# Altium footprint library LC-Standard-FootPrints-AD-V1.00工程师同事给的标准库（含3D）.PcbLib: 463 footprints (part 7 of 29)
Each footprint in its own frame and in the unit in brackets; x right, y up, seen from the top. Pads: shape width x height; smd on the part's side, far side on the other; paste and mask are expansions set on the pad; w line width, h text height; cw(c..) or ccw(c..) is an arc to the next point about the centre after c.
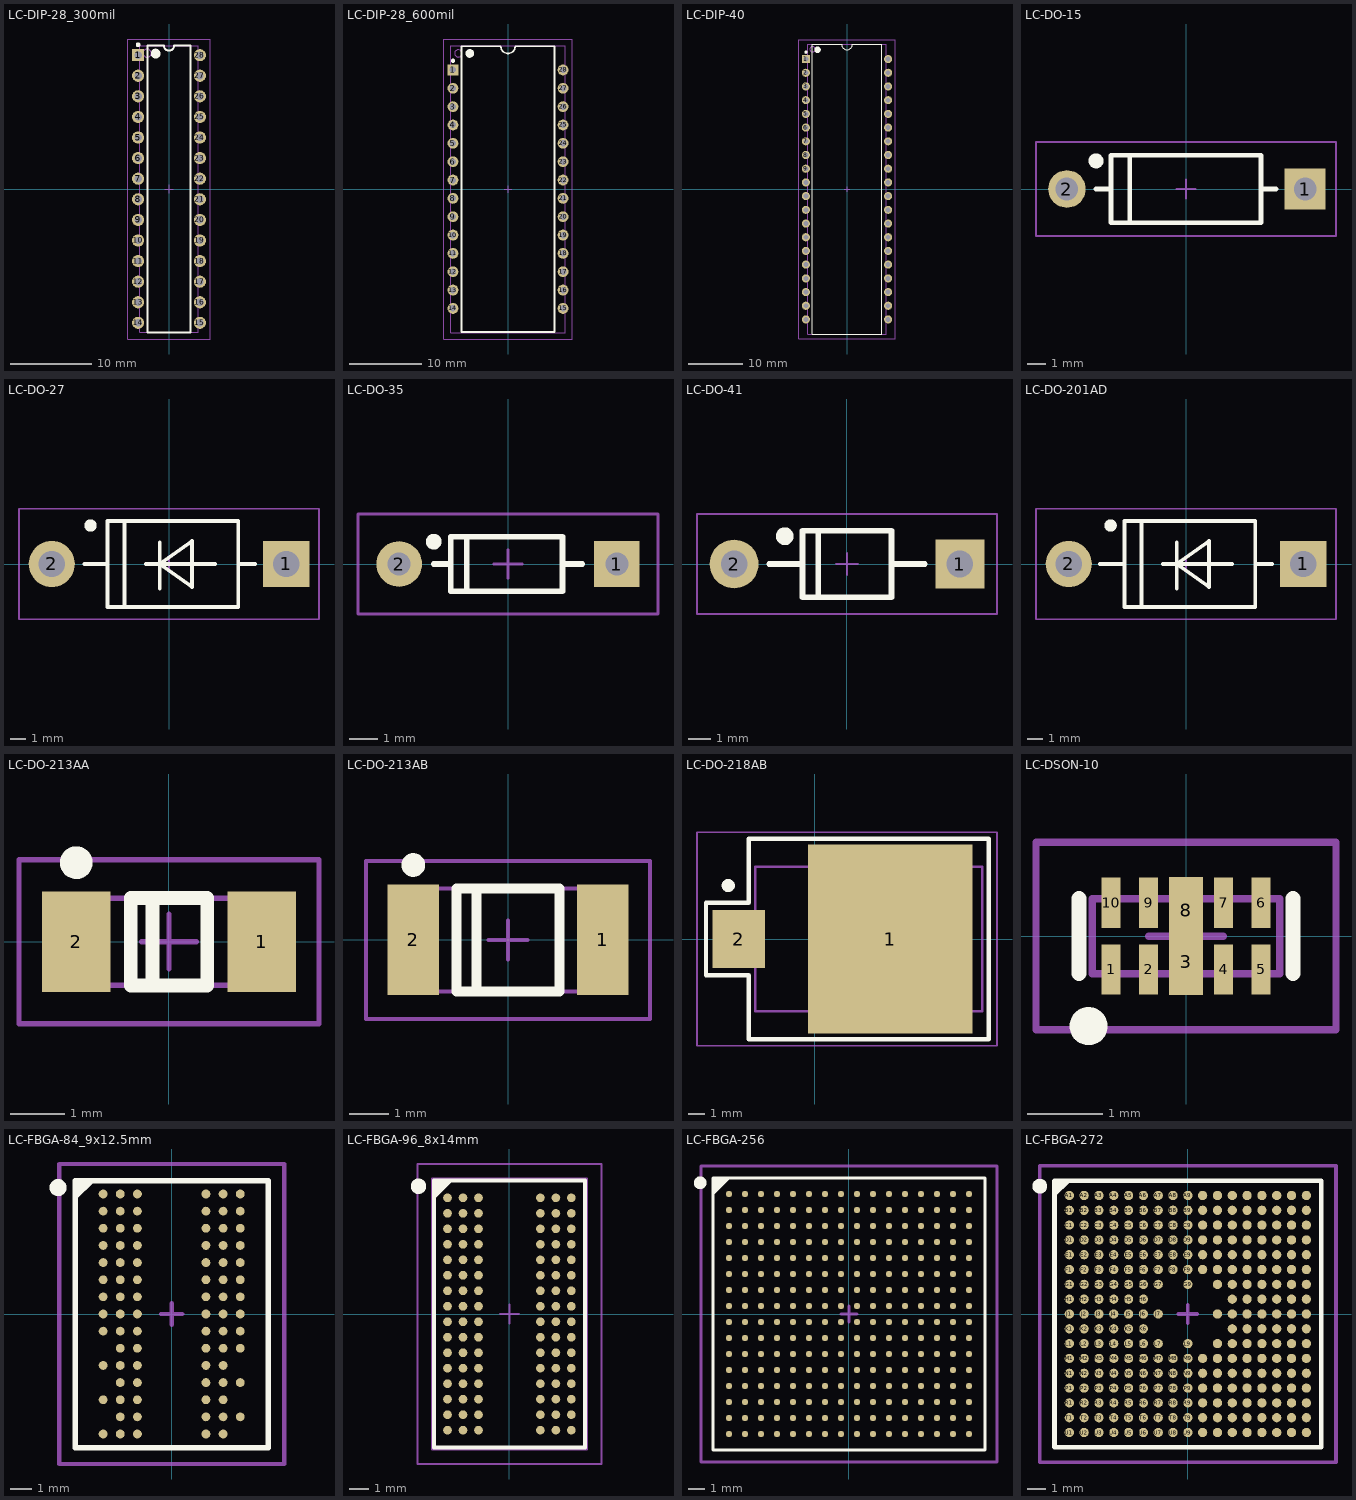
[diagram p6: the footprints below, top view; thin cyan lines are the x and y axes]

## LC-DIP-28_300mil [mm]
pads (28):
  rect 1.5x1.5 hole 0.9: 1(-3.81,16.51)
  round 1.5 hole 0.9: 2(-3.81,13.97) 3(-3.81,11.43) 4(-3.81,8.89) 5(-3.81,6.35) 6(-3.81,3.81) 7(-3.81,1.27) 8(-3.81,-1.27) 9(-3.81,-3.81) 10(-3.81,-6.35) 11(-3.81,-8.89) 12(-3.81,-11.43) 13(-3.81,-13.97) 14(-3.81,-16.51) 15(3.81,-16.51) 16(3.81,-13.97) 17(3.81,-11.43) 18(3.81,-8.89) 19(3.81,-6.35) 20(3.81,-3.81) 21(3.81,-1.27) 22(3.81,1.27) 23(3.81,3.81) 24(3.81,6.35) 25(3.81,8.89) 26(3.81,11.43) 27(3.81,13.97) 28(3.81,16.51)
Top Overlay:
  circle w0.6: c-1.65,16.7 r0.3
  circle w0.3: c-3.8,17.79 r0.15
  lines w0.254: -2.65,-17.7 2.65,-17.7 2.65,17.7 0.635,17.7 cw(c0,17.7) -0.635,17.7 -2.65,17.7 -2.65,-17.7
Mechanical 13:
  circle w0.1: c-2.7,16.75 r0.5
  lines w0.1: -3.6,-17.65 3.6,-17.65 3.6,17.65 -3.6,17.65 -3.6,-17.65
Mechanical 15:
  lines w0.1: -0.5,0 0.5,0 ; 0,-0.5 0,0.5 ; -5.1,-18.5 -5.1,18.5 5.1,18.5 5.1,-18.5 -5.1,-18.5

## LC-DIP-28_600mil [mm]
pads (28):
  rect 1.5x1.5 hole 0.9: 1(-7.62,16.51)
  round 1.5 hole 0.9: 2(-7.62,13.97) 3(-7.62,11.43) 4(-7.62,8.89) 5(-7.62,6.35) 6(-7.62,3.81) 7(-7.62,1.27) 8(-7.62,-1.27) 9(-7.62,-3.81) 10(-7.62,-6.35) 11(-7.62,-8.89) 12(-7.62,-11.43) 13(-7.62,-13.97) 14(-7.62,-16.51) 15(7.62,-16.51) 16(7.62,-13.97) 17(7.62,-11.43) 18(7.62,-8.89) 19(7.62,-6.35) 20(7.62,-3.81) 21(7.62,-1.27) 22(7.62,1.27) 23(7.62,3.81) 24(7.62,6.35) 25(7.62,8.89) 26(7.62,11.43) 27(7.62,13.97) 28(7.62,16.51)
Top Overlay:
  circle w0.6: c-5.3,18.8 r0.3
  circle w0.3: c-7.61,17.79 r0.15
  lines w0.254: -6.45,-19.8 6.45,-19.8 6.45,19.8 1,19.8 cw(c0,19.8) -1,19.8 -6.45,19.8 -6.45,-19.8
Mechanical 13:
  circle w0.1: c-6.9,18.8 r0.5
  lines w0.1: -7.94,-19.875 7.94,-19.875 7.94,19.875 -7.94,19.875 -7.94,-19.875
Mechanical 15:
  lines w0.1: -0.5,0 0.5,0 ; 0,-0.5 0,0.5 ; -8.9,-20.75 8.9,-20.75 8.9,20.75 -8.9,20.75 -8.9,-20.75

## LC-DIP-40 [mm]
pads (40):
  rect 1.5x1.5 hole 0.9: 1(-7.62,24.13)
  round 1.5 hole 0.9: 2(-7.62,21.59) 3(-7.62,19.05) 4(-7.62,16.51) 5(-7.62,13.97) 6(-7.62,11.43) 7(-7.62,8.89) 8(-7.62,6.35) 9(-7.62,3.81) 10(-7.62,1.27) 11(-7.62,-1.27) 12(-7.62,-3.81) 13(-7.62,-6.35) 14(-7.62,-8.89) 15(-7.62,-11.43) 16(-7.62,-13.97) 17(-7.62,-16.51) 18(-7.62,-19.05) 19(-7.62,-21.59) 20(-7.62,-24.13) 21(7.62,-24.13) 22(7.62,-21.59) 23(7.62,-19.05) 24(7.62,-16.51) 25(7.62,-13.97) 26(7.62,-11.43) 27(7.62,-8.89) 28(7.62,-6.35) 29(7.62,-3.81) 30(7.62,-1.27) 31(7.62,1.27) 32(7.62,3.81) 33(7.62,6.35) 34(7.62,8.89) 35(7.62,11.43) 36(7.62,13.97) 37(7.62,16.51) 38(7.62,19.05) 39(7.62,21.59) 40(7.62,24.13)
Top Overlay:
  circle w0.3: c-7.61,25.41 r0.15
  circle w0.6: c-5.45,25.85 r0.3
  lines w0.2: -6.45,-26.85 -6.45,26.85 -1,26.85 ccw(c0,26.85) 1,26.85 6.45,26.85 6.45,-26.85 -6.45,-26.85
Mechanical 13:
  circle w0.1: c-6.4,25.95 r0.5
  lines w0.1: -7.3,-26.85 -7.3,26.85 7.3,26.85 7.3,-26.85 -7.3,-26.85
Mechanical 15:
  lines w0.1: -0.5,0 0.5,0 ; 0,-0.5 0,0.5 ; -8.9,-27.75 -8.9,27.75 8.9,27.75 8.9,-27.75 -8.9,-27.75

## LC-DO-15 [mm]
pads (2):
  rect 2.2x2.2 hole 1.2: 1(6.35,0)
  round 2 hole 1.2: 2(-6.35,0)
Top Overlay:
  circle w0.4: c-4.8,1.5 r0.2
  lines w0.254: -4.8,0 -4,0 ; -3,-1.8 -3,1.8 ; 4,0 4.8,0 ; -4,-1.8 -4,1.8 4,1.8 4,-1.8 -4,-1.8
Mechanical 15:
  lines w0.1: -0.5,0 0.5,0 ; 0,-0.5 0,0.5 ; -8,-2.5 8,-2.5 8,2.5 -8,2.5 -8,-2.5
3D body: height 4.03, standoff -1.5, extent -6.875,-1.749 6.875,1.748

## LC-DO-27 [mm]
pads (2):
  rect 3x3 hole 1.7: 1(7.62,0)
  round 3 hole 1.7: 2(-7.62,0)
Top Overlay:
  circle w0.4: c-5.1,2.5 r0.2
  lines w0.254: -5.5,0 -4,0 ; -2.9,-2.8 -2.9,2.8 ; -1.5,0 -0.6,0 ; -0.6,-1.6 -0.6,1.4 ; 3,0 -0.6,0 ; 4.5,0 5.6,0 ; -0.6,0 1.5,-1.5 1.5,1.5 -0.6,0 ; -4,-2.8 -4,2.8 4.5,2.8 4.5,-2.8 -4,-2.8
Mechanical 15:
  lines w0.1: -0.5,0 0.5,0 ; 0,-0.5 0,0.5 ; -9.75,-3.6 -9.75,3.6 9.75,3.6 9.75,-3.6 -9.75,-3.6
3D body: height 6.6, standoff -5, extent -8.28,-2.8 8.28,2.8

## LC-DO-35 [mm]
pads (2):
  rect 1.6x1.6 hole 0.8: 1(3.81,0)
  round 1.6 hole 0.8: 2(-3.81,0)
Top Overlay:
  circle w0.3: c-2.6,0.78 r0.125
  lines w0.2: -2.6,0 -2.001,0 ; -1.448,-0.95 -1.448,0.95 ; 1.899,-0.95 -2.001,-0.95 -2.001,0.95 1.899,0.95 ; 1.911,-0.95 1.911,0.95 ; 1.911,0 2.6,0
Mechanical 15:
  lines w0.1: -0.5,0 0.5,0 ; 0,-0.5 0,0.5 ; -5.25,-1.75 5.25,-1.75 5.25,1.75 -5.25,1.75 -5.25,-1.75
3D body: height 1.92, standoff -1.9, extent -4.098,-0.888 4.072,0.914

## LC-DO-41 [mm]
pads (2):
  rect 2.2x2.2 hole 1.2: 1(5.08,0)
  round 2.2 hole 1.2: 2(-5.08,0)
Top Overlay:
  circle w0.4: c-2.8,1.25 r0.2
  lines w0.254: -3.5,0 -2,0 ; -1.3,-1.4 -1.3,1.5 ; 2,0 3.5,0 ; -2,-1.5 2,-1.5 2,1.5 -2,1.5 -2,-1.5
Mechanical 15:
  lines w0.1: -0.5,0 0.5,0 ; 0,-0.5 0,0.5 ; -6.75,-2.25 6.75,-2.25 6.75,2.25 -6.75,2.25 -6.75,-2.25
3D body: height 3.35, standoff -2, extent -5.51,-1.35 5.51,1.35

## LC-DO-201AD [mm]
pads (2):
  rect 3x3 hole 1.7: 1(7.62,0)
  round 3 hole 1.7: 2(-7.62,0)
Top Overlay:
  circle w0.4: c-4.9,2.5 r0.2
  lines w0.254: -5.6,0 -4,0 ; -2.9,-2.8 -2.9,2.8 ; -1.5,0 -0.6,0 ; -0.6,-1.6 -0.6,1.4 ; 3,0 -0.6,0 ; 4.5,0 5.6,0 ; -0.6,0 1.5,1.5 1.5,-1.5 -0.6,0 ; -4,-2.8 4.5,-2.8 4.5,2.8 -4,2.8 -4,-2.8
Mechanical 15:
  lines w0.1: -0.5,0 0.5,0 ; 0,-0.5 0,0.5 ; -9.75,-3.6 9.75,-3.6 9.75,3.6 -9.75,3.6 -9.75,-3.6
3D body: height 6.6, standoff -5, extent -8.28,-2.8 8.28,2.8

## LC-DO-213AA [mm]
pads (2):
  rect 1.25x1.85 smd: 1(1.7,0) 2(-1.7,0)
Top Overlay:
  circle w0.3: c-1.7,1.45 r0.15
  lines w0.254: -0.3,-0.7 -0.3,0.8 ; -0.7,-0.8 -0.7,0.8 0.7,0.8 0.7,-0.8 -0.7,-0.8
Mechanical 13:
  lines w0.1: -1.8,-0.8 -1.8,0.8 1.8,0.8 1.8,-0.8 -1.8,-0.8
Mechanical 15:
  lines w0.1: -0.5,0 0.5,0 ; 0,-0.5 0,0.5 ; -2.75,-1.5 2.75,-1.5 2.75,1.5 -2.75,1.5 -2.75,-1.5

## LC-DO-213AB [mm]
pads (2):
  rect 1.3x2.8 smd: 1(2.4,0) 2(-2.4,0)
Top Overlay:
  circle w0.3: c-2.4,1.9 r0.15
  lines w0.254: -0.8,-1.3 -0.8,1.3 ; -1.3,-1.3 1.3,-1.3 1.3,1.3 -1.3,1.3 -1.3,-1.3
Mechanical 13:
  lines w0.1: -2.5,-1.3 2.5,-1.3 2.5,1.3 -2.5,1.3 -2.5,-1.3
Mechanical 15:
  lines w0.1: -0.5,0 0.5,0 ; 0,-0.5 0,0.5 ; -3.6,-2 -3.6,2 3.6,2 3.6,-2 -3.6,-2

## LC-DO-218AB [mm]
pads (2):
  rect 10x11.5 smd: 1(4.6,0)
  rect 3.2x3.5 smd: 2(-4.6,0)
Top Overlay:
  circle w0.4: c-5.25,3.25 r0.2
  lines w0.254: -6.6,-2.2 -4,-2.2 -4,-6.1 10.6,-6.1 10.6,6.1 -4,6.1 -4,2.2 -6.6,2.2 -6.6,-2.2
Mechanical 13:
  lines w0.152: -3.6,-4.4 10.2,-4.4 10.2,4.4 -3.6,4.4 -3.6,-4.4
Mechanical 15:
  lines w0.1: 4.1,0 5.1,0 ; 4.6,-0.5 4.6,0.5 ; -7.15,-6.5 -7.15,6.5 11.1,6.5 11.1,-6.5 -7.15,-6.5
3D body: height 5, standoff 0, extent -5.2,-5 10.229,5

## LC-DSON-10 [mm]
pads (10):
  rect 0.25x0.67 smd mask+0.051: 1(-1,-0.445) 2(-0.5,-0.445) 4(0.5,-0.445) 5(1,-0.445) 6(1,0.445) 7(0.5,0.445) 9(-0.5,0.445) 10(-1,0.445)
  rect 0.45x0.889 smd mask+0.051: 3(0,-0.343) 8(0,0.343)
Top Overlay:
  circle w0.254: c-1.3,-1.2 r0.127
  lines w0.2: -1.43,-0.5 -1.43,0.5 ; 1.43,-0.5 1.43,0.5
Mechanical 13:
  lines w0.1: -1.25,-0.5 1.25,-0.5 1.25,0.5 -1.25,0.5 -1.25,-0.5
Mechanical 15:
  lines w0.1: -0.5,0 0.5,0 ; 0,-0.5 0,0.5 ; -2,-1.25 -2,1.25 2,1.25 2,-1.25 -2,-1.25

## LC-FBGA-84_9x12.5mm [mm]
pads (84):
  round 0.41 smd: A1(-3.2,5.6) A2(-2.4,5.6) A3(-1.6,5.6) A7(1.6,5.6) A8(2.4,5.6) A9(3.2,5.6) B1(-3.2,4.8) B2(-2.4,4.8) B3(-1.6,4.8) B7(1.6,4.8) B8(2.4,4.8) B9(3.2,4.8) C1(-3.2,4) C2(-2.4,4) C3(-1.6,4) C7(1.6,4) C8(2.4,4) C9(3.2,4) D1(-3.2,3.2) D2(-2.4,3.2) D3(-1.6,3.2) D7(1.6,3.2) D8(2.4,3.2) D9(3.2,3.2) E1(-3.2,2.4) E2(-2.4,2.4) E3(-1.6,2.4) E7(1.6,2.4) E8(2.4,2.4) E9(3.2,2.4) F1(-3.2,1.6) F2(-2.4,1.6) F3(-1.6,1.6) F7(1.6,1.6) F8(2.4,1.6) F9(3.2,1.6) G1(-3.2,0.8) G2(-2.4,0.8) G3(-1.6,0.8) G7(1.6,0.8) G8(2.4,0.8) G9(3.2,0.8) H1(-3.2,0) H2(-2.4,0) H3(-1.6,0) H7(1.6,0) H8(2.4,0) H9(3.2,0) J1(-3.2,-0.8) J2(-2.4,-0.8) J3(-1.6,-0.8) J7(1.6,-0.8) J8(2.4,-0.8) J9(3.2,-0.8) K2(-2.4,-1.6) K3(-1.6,-1.6) K7(1.6,-1.6) K8(2.4,-1.6) K9(3.2,-1.6) L1(-3.2,-2.4) L2(-2.4,-2.4) L3(-1.6,-2.4) L7(1.6,-2.4) L8(2.4,-2.4) M2(-2.4,-3.2) M3(-1.6,-3.2) M7(1.6,-3.2) M8(2.4,-3.2) M9(3.2,-3.2) N1(-3.2,-4) N2(-2.4,-4) N3(-1.6,-4) N7(1.6,-4) N8(2.4,-4) P2(-2.4,-4.8) P3(-1.6,-4.8) P7(1.6,-4.8) P8(2.4,-4.8) P9(3.2,-4.8) R1(-3.2,-5.6) R2(-2.4,-5.6) R3(-1.6,-5.6) R7(1.6,-5.6) R8(2.4,-5.6)
Top Overlay:
  circle w0.4: c-5.3,5.9 r0.2
  region: -4.5,6.231 -4.5,5.3 -3.573,6.227 -3.573,6.231
  lines w0.254: -4.5,-6.25 4.5,-6.25 4.5,6.223 -4.5,6.223 -4.5,-6.25
Mechanical 15:
  lines w0.2: -0.5,0 0.5,0 ; 0,-0.5 0,0.5 ; -5.25,-7 -5.25,7 5.25,7 5.25,-7 -5.25,-7

## LC-FBGA-96_8x14mm [mm]
pads (96):
  round 0.45 smd: A1(-3.2,6) A2(-2.4,6) A3(-1.6,6) A7(1.6,6) A8(2.4,6) A9(3.2,6) B1(-3.2,5.2) B2(-2.4,5.2) B3(-1.6,5.2) B7(1.6,5.2) B8(2.4,5.2) B9(3.2,5.2) C1(-3.2,4.4) C2(-2.4,4.4) C3(-1.6,4.4) C7(1.6,4.4) C8(2.4,4.4) C9(3.2,4.4) D1(-3.2,3.6) D2(-2.4,3.6) D3(-1.6,3.6) D7(1.6,3.6) D8(2.4,3.6) D9(3.2,3.6) E1(-3.2,2.8) E2(-2.4,2.8) E3(-1.6,2.8) E7(1.6,2.8) E8(2.4,2.8) E9(3.2,2.8) F1(-3.2,2) F2(-2.4,2) F3(-1.6,2) F7(1.6,2) F8(2.4,2) F9(3.2,2) G1(-3.2,1.2) G2(-2.4,1.2) G3(-1.6,1.2) G7(1.6,1.2) G8(2.4,1.2) G9(3.2,1.2) H1(-3.2,0.4) H2(-2.4,0.4) H3(-1.6,0.4) H7(1.6,0.4) H8(2.4,0.4) H9(3.2,0.4) J1(-3.2,-0.4) J2(-2.4,-0.4) J3(-1.6,-0.4) J7(1.6,-0.4) J8(2.4,-0.4) J9(3.2,-0.4) K1(-3.2,-1.2) K2(-2.4,-1.2) K3(-1.6,-1.2) K7(1.6,-1.2) K8(2.4,-1.2) K9(3.2,-1.2) L1(-3.2,-2) L2(-2.4,-2) L3(-1.6,-2) L7(1.6,-2) L8(2.4,-2) L9(3.2,-2) M1(-3.2,-2.8) M2(-2.4,-2.8) M3(-1.6,-2.8) M7(1.6,-2.8) M8(2.4,-2.8) M9(3.2,-2.8) N1(-3.2,-3.6) N2(-2.4,-3.6) N3(-1.6,-3.6) N7(1.6,-3.6) N8(2.4,-3.6) N9(3.2,-3.6) P1(-3.2,-4.4) P2(-2.4,-4.4) P3(-1.6,-4.4) P7(1.6,-4.4) P8(2.4,-4.4) P9(3.2,-4.4) R1(-3.2,-5.2) R2(-2.4,-5.2) R3(-1.6,-5.2) R7(1.6,-5.2) R8(2.4,-5.2) R9(3.2,-5.2) T1(-3.2,-6) T2(-2.4,-6) T3(-1.6,-6) T7(1.6,-6) T8(2.4,-6) T9(3.2,-6)
Top Overlay:
  circle w0.4: c-4.7,6.6 r0.2
  region: -2.9,6.9 -3.9,5.9 -3.9,6.9
  lines w0.2: -3.9,-6.9 3.9,-6.9 3.9,6.9 -3.9,6.9 -3.9,-6.9
Mechanical 13:
  lines w0.1: -4,-7 4,-7 4,7 -4,7 -4,-7
Mechanical 15:
  lines w0.1: -0.5,0 0.5,0 ; 0,-0.5 0,0.5 ; -4.75,-7.75 -4.75,7.75 4.75,7.75 4.75,-7.75 -4.75,-7.75

## LC-FBGA-256 [mm]
pads (256):
  round 0.4 smd: A1(-7.5,7.5) A2(-6.5,7.5) A3(-5.5,7.5) A4(-4.5,7.5) A5(-3.5,7.5) A6(-2.5,7.5) A7(-1.5,7.5) A8(-0.5,7.5) A9(0.5,7.5) A10(1.5,7.5) A11(2.5,7.5) A12(3.5,7.5) A13(4.5,7.5) A14(5.5,7.5) A15(6.5,7.5) A16(7.5,7.5) B1(-7.5,6.5) B2(-6.5,6.5) B3(-5.5,6.5) B4(-4.5,6.5) B5(-3.5,6.5) B6(-2.5,6.5) B7(-1.5,6.5) B8(-0.5,6.5) B9(0.5,6.5) B10(1.5,6.5) B11(2.5,6.5) B12(3.5,6.5) B13(4.5,6.5) B14(5.5,6.5) B15(6.5,6.5) B16(7.5,6.5) C1(-7.5,5.5) C2(-6.5,5.5) C3(-5.5,5.5) C4(-4.5,5.5) C5(-3.5,5.5) C6(-2.5,5.5) C7(-1.5,5.5) C8(-0.5,5.5) C9(0.5,5.5) C10(1.5,5.5) C11(2.5,5.5) C12(3.5,5.5) C13(4.5,5.5) C14(5.5,5.5) C15(6.5,5.5) C16(7.5,5.5) D1(-7.5,4.5) D2(-6.5,4.5) D3(-5.5,4.5) D4(-4.5,4.5) D5(-3.5,4.5) D6(-2.5,4.5) D7(-1.5,4.5) D8(-0.5,4.5) D9(0.5,4.5) D10(1.5,4.5) D11(2.5,4.5) D12(3.5,4.5) D13(4.5,4.5) D14(5.5,4.5) D15(6.5,4.5) D16(7.5,4.5) E1(-7.5,3.5) E2(-6.5,3.5) E3(-5.5,3.5) E4(-4.5,3.5) E5(-3.5,3.5) E6(-2.5,3.5) E7(-1.5,3.5) E8(-0.5,3.5) E9(0.5,3.5) E10(1.5,3.5) E11(2.5,3.5) E12(3.5,3.5) E13(4.5,3.5) E14(5.5,3.5) E15(6.5,3.5) E16(7.5,3.5) F1(-7.5,2.5) F2(-6.5,2.5) F3(-5.5,2.5) F4(-4.5,2.5) F5(-3.5,2.5) F6(-2.5,2.5) F7(-1.5,2.5) F8(-0.5,2.5) F9(0.5,2.5) F10(1.5,2.5) F11(2.5,2.5) F12(3.5,2.5) F13(4.5,2.5) F14(5.5,2.5) F15(6.5,2.5) F16(7.5,2.5) G1(-7.5,1.5) G2(-6.5,1.5) G3(-5.5,1.5) G4(-4.5,1.5) G5(-3.5,1.5) G6(-2.5,1.5) G7(-1.5,1.5) G8(-0.5,1.5) G9(0.5,1.5) G10(1.5,1.5) G11(2.5,1.5) G12(3.5,1.5) G13(4.5,1.5) G14(5.5,1.5) G15(6.5,1.5) G16(7.5,1.5) H1(-7.5,0.5) H2(-6.5,0.5) H3(-5.5,0.5) H4(-4.5,0.5) H5(-3.5,0.5) H6(-2.5,0.5) H7(-1.5,0.5) H8(-0.5,0.5) H9(0.5,0.5) H10(1.5,0.5) H11(2.5,0.5) H12(3.5,0.5) H13(4.5,0.5) H14(5.5,0.5) H15(6.5,0.5) H16(7.5,0.5) J1(-7.5,-0.5) J2(-6.5,-0.5) J3(-5.5,-0.5) J4(-4.5,-0.5) J5(-3.5,-0.5) J6(-2.5,-0.5) J7(-1.5,-0.5) J8(-0.5,-0.5) J9(0.5,-0.5) J10(1.5,-0.5) J11(2.5,-0.5) J12(3.5,-0.5) J13(4.5,-0.5) J14(5.5,-0.5) J15(6.5,-0.5) J16(7.5,-0.5) K1(-7.5,-1.5) K2(-6.5,-1.5) K3(-5.5,-1.5) K4(-4.5,-1.5) K5(-3.5,-1.5) K6(-2.5,-1.5) K7(-1.5,-1.5) K8(-0.5,-1.5) K9(0.5,-1.5) K10(1.5,-1.5) K11(2.5,-1.5) K12(3.5,-1.5) K13(4.5,-1.5) K14(5.5,-1.5) K15(6.5,-1.5) K16(7.5,-1.5) L1(-7.5,-2.5) L2(-6.5,-2.5) L3(-5.5,-2.5) L4(-4.5,-2.5) L5(-3.5,-2.5) L6(-2.5,-2.5) L7(-1.5,-2.5) L8(-0.5,-2.5) L9(0.5,-2.5) L10(1.5,-2.5) L11(2.5,-2.5) L12(3.5,-2.5) L13(4.5,-2.5) L14(5.5,-2.5) L15(6.5,-2.5) L16(7.5,-2.5) M1(-7.5,-3.5) M2(-6.5,-3.5) M3(-5.5,-3.5) M4(-4.5,-3.5) M5(-3.5,-3.5) M6(-2.5,-3.5) M7(-1.5,-3.5) M8(-0.5,-3.5) M9(0.5,-3.5) M10(1.5,-3.5) M11(2.5,-3.5) M12(3.5,-3.5) M13(4.5,-3.5) M14(5.5,-3.5) M15(6.5,-3.5) M16(7.5,-3.5) N1(-7.5,-4.5) N2(-6.5,-4.5) N3(-5.5,-4.5) N4(-4.5,-4.5) N5(-3.5,-4.5) N6(-2.5,-4.5) N7(-1.5,-4.5) N8(-0.5,-4.5) N9(0.5,-4.5) N10(1.5,-4.5) N11(2.5,-4.5) N12(3.5,-4.5) N13(4.5,-4.5) N14(5.5,-4.5) N15(6.5,-4.5) N16(7.5,-4.5) P1(-7.5,-5.5) P2(-6.5,-5.5) P3(-5.5,-5.5) P4(-4.5,-5.5) P5(-3.5,-5.5) P6(-2.5,-5.5) P7(-1.5,-5.5) P8(-0.5,-5.5) P9(0.5,-5.5) P10(1.5,-5.5) P11(2.5,-5.5) P12(3.5,-5.5) P13(4.5,-5.5) P14(5.5,-5.5) P15(6.5,-5.5) P16(7.5,-5.5) R1(-7.5,-6.5) R2(-6.5,-6.5) R3(-5.5,-6.5) R4(-4.5,-6.5) R5(-3.5,-6.5) R6(-2.5,-6.5) R7(-1.5,-6.5) R8(-0.5,-6.5) R9(0.5,-6.5) R10(1.5,-6.5) R11(2.5,-6.5) R12(3.5,-6.5) R13(4.5,-6.5) R14(5.5,-6.5) R15(6.5,-6.5) R16(7.5,-6.5) T1(-7.5,-7.5) T2(-6.5,-7.5) T3(-5.5,-7.5) T4(-4.5,-7.5) T5(-3.5,-7.5) T6(-2.5,-7.5) T7(-1.5,-7.5) T8(-0.5,-7.5) T9(0.5,-7.5) T10(1.5,-7.5) T11(2.5,-7.5) T12(3.5,-7.5) T13(4.5,-7.5) T14(5.5,-7.5) T15(6.5,-7.5) T16(7.5,-7.5)
Top Overlay:
  circle w0.4: c-9.3,8.2 r0.2
  region: -7.5,8.5 -8.5,7.5 -8.5,8.5
  lines w0.2: -8.5,7.5 -7.5,8.5 ; -8.5,-8.5 -8.5,8.5 8.5,8.5 8.5,-8.5 -8.5,-8.5
Mechanical 13:
  lines w0.1: -8.5,-8.5 -8.5,8.5 8.5,8.5 8.5,-8.5 -8.5,-8.5
Mechanical 15:
  lines w0.2: -0.5,0 0.5,0 ; 0,-0.5 0,0.5 ; -9.25,-9.25 -9.25,9.25 9.25,9.25 9.25,-9.25 -9.25,-9.25

## LC-FBGA-272 [mm]
pads (272):
  round 0.5 smd: A1(-6.401,6.401) A2(-5.601,6.401) A3(-4.801,6.401) A4(-4.001,6.401) A5(-3.201,6.401) A6(-2.401,6.401) A7(-1.601,6.401) A8(-0.801,6.401) A9(-0.001,6.401) A10(0.799,6.401) A11(1.599,6.401) A12(2.399,6.401) A13(3.199,6.401) A14(3.999,6.401) A15(4.799,6.401) A16(5.599,6.401) A17(6.399,6.401) B1(-6.401,5.601) B2(-5.601,5.601) B3(-4.801,5.601) B4(-4.001,5.601) B5(-3.201,5.601) B6(-2.401,5.601) B7(-1.601,5.601) B8(-0.801,5.601) B9(-0.001,5.601) B10(0.799,5.601) B11(1.599,5.601) B12(2.399,5.601) B13(3.199,5.601) B14(3.999,5.601) B15(4.799,5.601) B16(5.599,5.601) B17(6.399,5.601) C1(-6.401,4.801) C2(-5.601,4.801) C3(-4.801,4.801) C4(-4.001,4.801) C5(-3.201,4.801) C6(-2.401,4.801) C7(-1.601,4.801) C8(-0.801,4.801) C9(-0.001,4.801) C10(0.799,4.801) C11(1.599,4.801) C12(2.399,4.801) C13(3.199,4.801) C14(3.999,4.801) C15(4.799,4.801) C16(5.599,4.801) C17(6.399,4.801) D1(-6.401,4.001) D2(-5.601,4.001) D3(-4.801,4.001) D4(-4.001,4.001) D5(-3.201,4.001) D6(-2.401,4.001) D7(-1.601,4.001) D8(-0.801,4.001) D9(-0.001,4.001) D10(0.799,4.001) D11(1.599,4.001) D12(2.399,4.001) D13(3.199,4.001) D14(3.999,4.001) D15(4.799,4.001) D16(5.599,4.001) D17(6.399,4.001) E1(-6.401,3.201) E2(-5.601,3.201) E3(-4.801,3.201) E4(-4.001,3.201) E5(-3.201,3.201) E6(-2.401,3.201) E7(-1.601,3.201) E8(-0.801,3.201) E9(-0.001,3.201) E10(0.799,3.201) E11(1.599,3.201) E12(2.399,3.201) E13(3.199,3.201) E14(3.999,3.201) E15(4.799,3.201) E16(5.599,3.201) E17(6.399,3.201) F1(-6.401,2.401) F2(-5.601,2.401) F3(-4.801,2.401) F4(-4.001,2.401) F5(-3.201,2.401) F6(-2.401,2.401) F7(-1.601,2.401) F8(-0.801,2.401) F9(-0.001,2.401) F10(0.799,2.401) F11(1.599,2.401) F12(2.399,2.401) F13(3.199,2.401) F14(3.999,2.401) F15(4.799,2.401) F16(5.599,2.401) F17(6.399,2.401) G1(-6.401,1.601) G2(-5.601,1.601) G3(-4.801,1.601) G4(-4.001,1.601) G5(-3.201,1.601) G6(-2.401,1.601) G7(-1.601,1.601) G9(-0.001,1.601) G11(1.599,1.601) G12(2.399,1.601) G13(3.199,1.601) G14(3.999,1.601) G15(4.799,1.601) G16(5.599,1.601) G17(6.399,1.601) H1(-6.401,0.801) H2(-5.601,0.801) H3(-4.801,0.801) H4(-4.001,0.801) H5(-3.201,0.801) H6(-2.401,0.801) H12(2.399,0.801) H13(3.199,0.801) H14(3.999,0.801) H15(4.799,0.801) H16(5.599,0.801) H17(6.399,0.801) J1(-6.401,0.001) J2(-5.601,0.001) J3(-4.801,0.001) J4(-4.001,0.001) J5(-3.201,0.001) J6(-2.401,0.001) J7(-1.601,0.001) J11(1.599,0.001) J12(2.399,0.001) J13(3.199,0.001) J14(3.999,0.001) J15(4.799,0.001) J16(5.599,0.001) J17(6.399,0.001) K1(-6.401,-0.799) K2(-5.601,-0.799) K3(-4.801,-0.799) K4(-4.001,-0.799) K5(-3.201,-0.799) K6(-2.401,-0.799) K12(2.399,-0.799) K13(3.199,-0.799) K14(3.999,-0.799) K15(4.799,-0.799) K16(5.599,-0.799) K17(6.399,-0.799) L1(-6.401,-1.599) L2(-5.601,-1.599) L3(-4.801,-1.599) L4(-4.001,-1.599) L5(-3.201,-1.599) L6(-2.401,-1.599) L7(-1.601,-1.599) L9(-0.001,-1.599) L11(1.599,-1.599) L12(2.399,-1.599) L13(3.199,-1.599) L14(3.999,-1.599) L15(4.799,-1.599) L16(5.599,-1.599) L17(6.399,-1.599) M1(-6.401,-2.399) M2(-5.601,-2.399) M3(-4.801,-2.399) M4(-4.001,-2.399) M5(-3.201,-2.399) M6(-2.401,-2.399) M7(-1.601,-2.399) M8(-0.801,-2.399) M9(-0.001,-2.399) M10(0.799,-2.399) M11(1.599,-2.399) M12(2.399,-2.399) M13(3.199,-2.399) M14(3.999,-2.399) M15(4.799,-2.399) M16(5.599,-2.399) M17(6.399,-2.399) N1(-6.401,-3.199) N2(-5.601,-3.199) N3(-4.801,-3.199) N4(-4.001,-3.199) N5(-3.201,-3.199) N6(-2.401,-3.199) N7(-1.601,-3.199) N8(-0.801,-3.199) N9(-0.001,-3.199) N10(0.799,-3.199) N11(1.599,-3.199) N12(2.399,-3.199) N13(3.199,-3.199) N14(3.999,-3.199) N15(4.799,-3.199) N16(5.599,-3.199) N17(6.399,-3.199) P1(-6.401,-3.999) P2(-5.601,-3.999) P3(-4.801,-3.999) P4(-4.001,-3.999) P5(-3.201,-3.999) P6(-2.401,-3.999) P7(-1.601,-3.999) P8(-0.801,-3.999) P9(-0.001,-3.999) P10(0.799,-3.999) P11(1.599,-3.999) P12(2.399,-3.999) P13(3.199,-3.999) P14(3.999,-3.999) P15(4.799,-3.999) P16(5.599,-3.999) P17(6.399,-3.999) R1(-6.401,-4.799) R2(-5.601,-4.799) R3(-4.801,-4.799) R4(-4.001,-4.799) R5(-3.201,-4.799) R6(-2.401,-4.799) R7(-1.601,-4.799) R8(-0.801,-4.799) R9(-0.001,-4.799) R10(0.799,-4.799) R11(1.599,-4.799) R12(2.399,-4.799) R13(3.199,-4.799) R14(3.999,-4.799) R15(4.799,-4.799) R16(5.599,-4.799) R17(6.399,-4.799) T1(-6.401,-5.599) T2(-5.601,-5.599) T3(-4.801,-5.599) T4(-4.001,-5.599) T5(-3.201,-5.599) T6(-2.401,-5.599) T7(-1.601,-5.599) T8(-0.801,-5.599) T9(-0.001,-5.599) T10(0.799,-5.599) T11(1.599,-5.599) T12(2.399,-5.599) T13(3.199,-5.599) T14(3.999,-5.599) T15(4.799,-5.599) T16(5.599,-5.599) T17(6.399,-5.599) U1(-6.401,-6.399) U2(-5.601,-6.399) U3(-4.801,-6.399) U4(-4.001,-6.399) U5(-3.201,-6.399) U6(-2.401,-6.399) U7(-1.601,-6.399) U8(-0.801,-6.399) U9(-0.001,-6.399) U10(0.799,-6.399) U11(1.599,-6.399) U12(2.399,-6.399) U13(3.199,-6.399) U14(3.999,-6.399) U15(4.799,-6.399) U16(5.599,-6.399) U17(6.399,-6.399)
Top Overlay:
  circle w0.4: c-8,6.9 r0.2
  region: -7.201,7.2 -7.2,6.4 -7.101,6.4 -6.4,7.1 -6.4,7.2 -7.2,7.2 -7.2,6.6
  lines w0.254: -7.201,7.2 -7.201,-7.199 7.199,-7.199 7.199,7.201 -7.2,7.201
Mechanical 15:
  lines w0.2: -0.5,0 0.5,0 ; 0,-0.5 0,0.5 ; -8,-8 -8,8 8,8 8,-8 -8,-8